# Altium schematic symbol library 6-Connectors 连接器.端子.SchLib: 402 symbols (part 1 of 5)
Pins are listed as number, name and electrical type; pins without a type are passive.

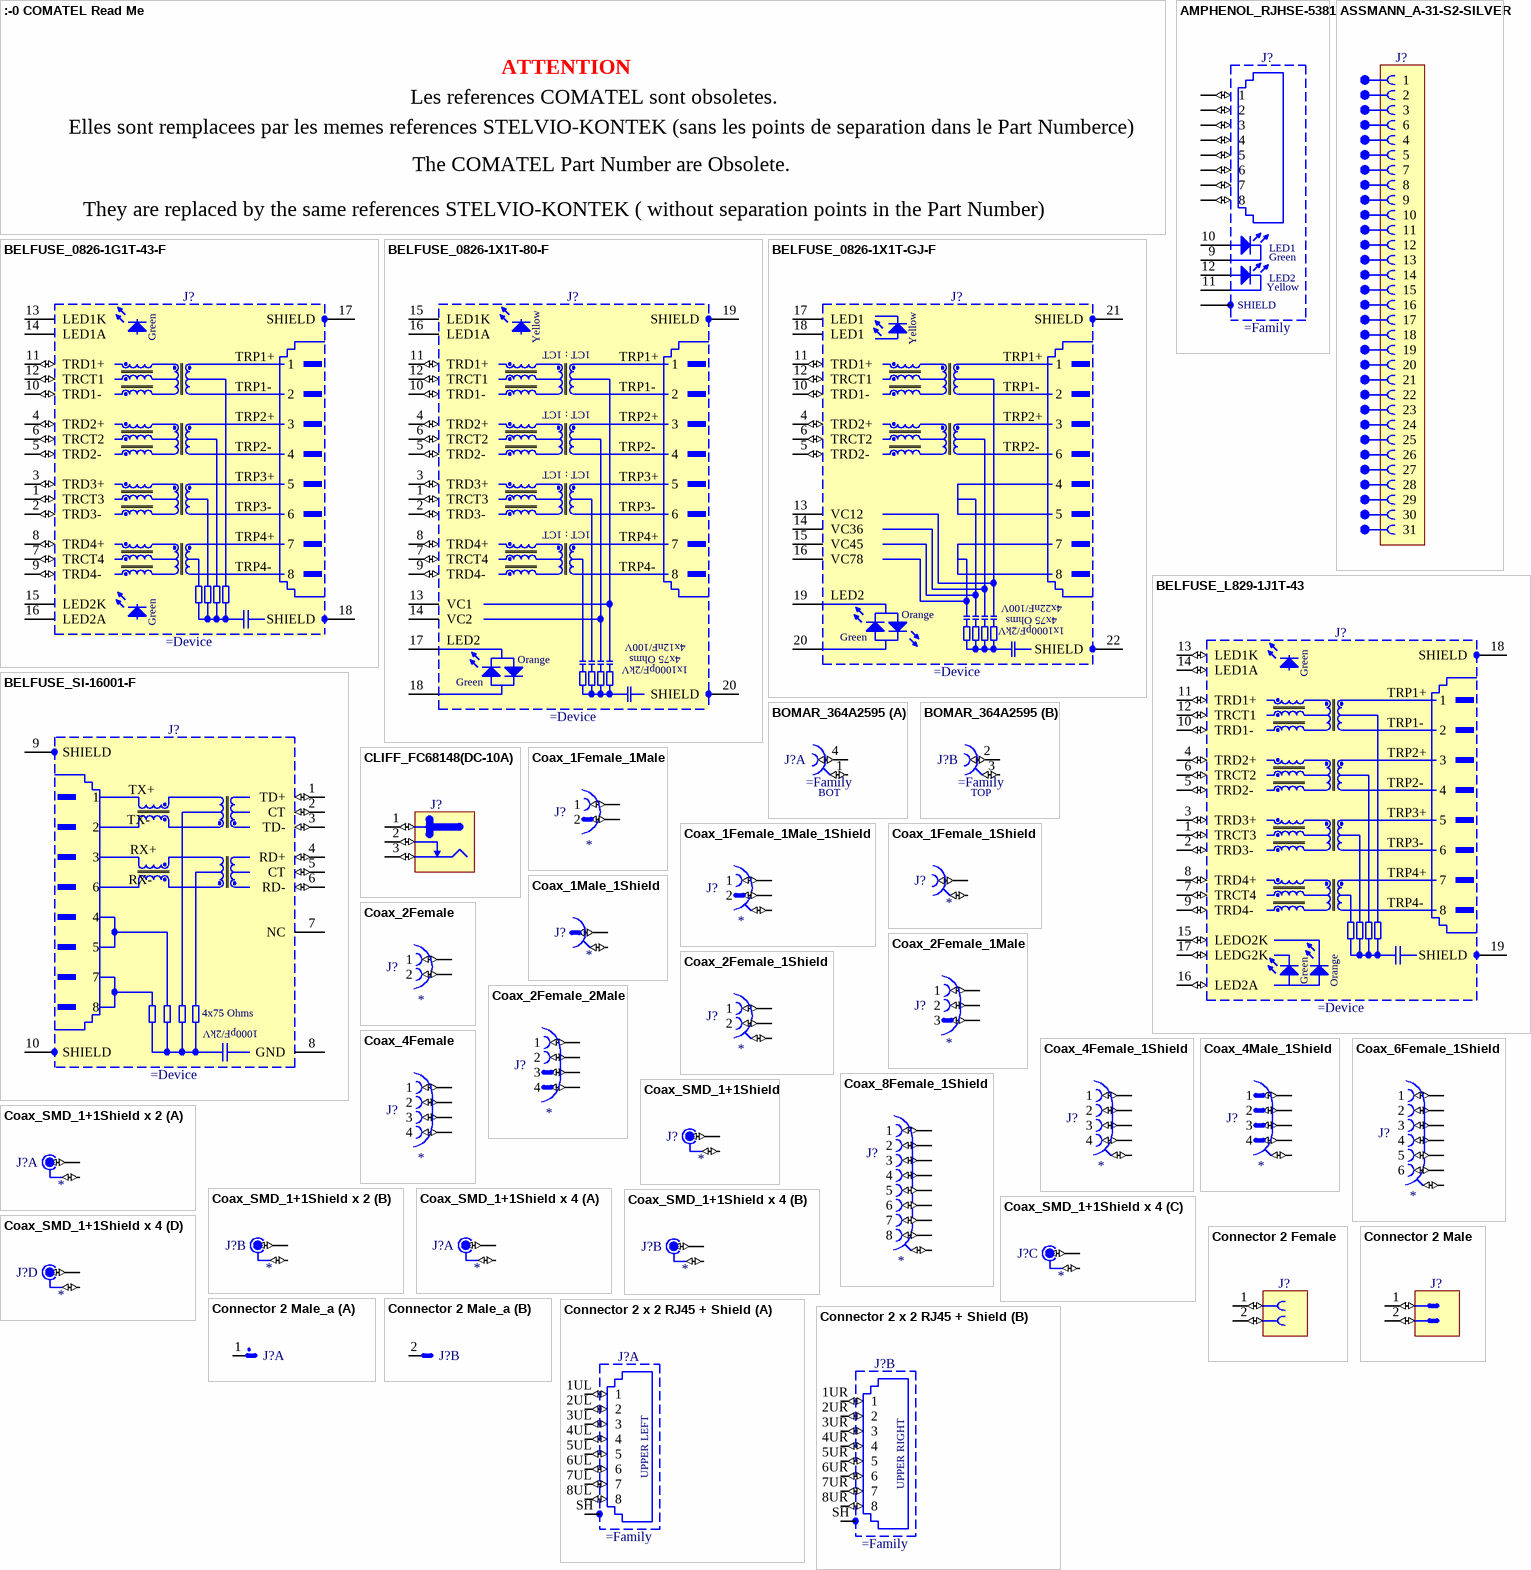
[diagram p0: symbols :-0 COMATEL Read Me to Connector 2 x 2 RJ45 + Shield]

## :-0 COMATEL Read Me
designator ATTENTION
Test Point
text: Les references COMATEL sont obsoletes.; Elles sont remplacees par les memes references STELVIO-KONTEK (sans les points de separation dans le Part Numberce); The COMATEL Part Number are Obsolete.; They are replaced by the same references STELVIO-KONTEK ( without separation points in the Part Number)

## AMPHENOL_RJHSE-5381
designator J?
1 Port, 8 Positions, CAT5 RJ45 Modular Connector With Yellow And Green LEDs
pins: 1 (io), 2 (io), 3 (io), 4 (io), 5 (io), 6 (io), 7 (io), 8 (io), 9 CLED1, 10 ALED1, 11 ALED2, 12 CLED2, SHIELD
text: LED1; Green; LED2; Yellow

## ASSMANN_A-31-S2-SILVER
designator J?
text: 1; 2; 3; 6; 4; 5; 7; 8; 9; 10; 11; 12; 13; 14; 15; 16; 17; 18; 19; 20; 21; 22; 23; 24; 25; 26; 27; 28; 29; 30; 31

## BELFUSE_0826-1G1T-43-F
designator J?
1 Port, Green/Green LEDs, RJ45 10/100/1000 Gigabit Ethernet, MagJack Connector Module
pins: 1 TRCT3 (io), 2 TRD3- (io), 3 TRD3+ (io), 4 TRD2+ (io), 5 TRD2- (io), 6 TRCT2 (io), 7 TRCT4 (io), 8 TRD4+ (io), 9 TRD4- (io), 10 TRD1- (io), 11 TRD1+ (io), 12 TRCT1 (io), 13 LED1K, 14 LED1A, 15 LED2K, 16 LED2A, 17 SHIELD (power), 18 SHIELD (power)
text: Green; TRP1+; TRP1-; TRP2+; TRP2-; TRP3+; TRP3-; TRP4+; TRP4-

## BELFUSE_0826-1X1T-80-F
designator J?
MagJack 1000BaseT, PoE+, 1X1, OG/Y, Tab Up, RoHS
pins: 1 TRCT3 (io), 2 TRD3- (io), 3 TRD3+ (io), 4 TRD2+ (io), 5 TRD2- (io), 6 TRCT2 (io), 7 TRCT4 (io), 8 TRD4+ (io), 9 TRD4- (io), 10 TRD1- (io), 11 TRD1+ (io), 12 TRCT1 (io), 13 VC1, 14 VC2, 15 LED1K, 16 LED1A, 17 LED2, 18 LED2, 19 SHIELD (power), 20 SHIELD (power)
text: Yellow; 1CT : 1CT; TRP1+; TRP1-; TRP2+; TRP2-; TRP3+; TRP3-; TRP4+; TRP4-; 4x12nF/100V; Orange; 4x75 Ohms; 1x1000pF/2kV; Green

## BELFUSE_0826-1X1T-GJ-F
designator J?
MagJack 10/100BaseT, PoE+, 1X1, OG/Y, -40 to 85*C, Tab Up, RoHS
pins: 4 TRD2+ (io), 5 TRD2- (io), 6 TRCT2 (io), 10 TRD1- (io), 11 TRD1+ (io), 12 TRCT1 (io), 13 VC12, 14 VC36, 15 VC45, 16 VC78, 17 LED1, 18 LED1, 19 LED2, 20 LED2, 21 SHIELD (power), 22 SHIELD (power)
text: Yellow; TRP1+; 1; TRP1-; 2; TRP2+; 3; TRP2-; 7; 8; Orange; 4x22nF/100V; 4x75 Ohms; Green; 1x1000pF/2kV

## BELFUSE_L829-1J1T-43
designator J?
1 Port, RJ45, Gigabit Ethernet, MagJack Connector Module With Yellow And Green/Orange LEDs,
pins: 1 TRCT3 (io), 2 TRD3- (io), 3 TRD3+ (io), 4 TRD2+ (io), 5 TRD2- (io), 6 TRCT2 (io), 7 TRCT4 (io), 8 TRD4+ (io), 9 TRD4- (io), 10 TRD1- (io), 11 TRD1+ (io), 12 TRCT1 (io), 13 LED1K (io), 14 LED1A (io), 15 LEDO2K (io), 16 LED2A (io), 17 LEDG2K (io), 18 SHIELD (power), 19 SHIELD (power)
text: Green; TRP1+; TRP1-; TRP2+; TRP2-; TRP3+; TRP3-; TRP4+; TRP4-; Orange

## BELFUSE_SI-16001-F
designator J?
1 Port, Without LED, RJ45 10/100Base-T Ethernet, MagJack® Vertical Connector Module
pins: 1 TD+ (io), 2 CT (io), 3 TD- (io), 4 RD+ (io), 5 CT (io), 6 RD- (io), 7 NC, 8 GND (power), 9 SHIELD (power), 10 SHIELD (power)
text: TX+; TX-; RX+; RX-; 4x75 Ohms; 1000pF/2kV

## BOMAR_364A2595
designator J?
Dual Right Angle 50 Ohm BNC Jack, White Valox Case
part A pins: 1 (io), 4 (io)
part B pins: 2 (io), 3 (io)
part A text: BOT
part B text: TOP

## CLIFF_FC68148(DC-10A)
designator J?
12V /  5A, 2.1mm Diameter Pin, DC Power Socket With  Switch. DC10A Type
pins: 1 (io), 2 (io), 3 (io)

## Coax_1Female_1Male
designator J?
Coax_1Female_1Male (No Shield)
pins: 1 (io), 2 (io)

## Coax_1Female_1Male_1Shield
designator J?
pins: 1 (io), 2 (io), 3 (io)

## Coax_1Female_1Shield
designator J?
pins: 1 (io), 2 (io)

## Coax_1Male_1Shield
designator J?
pins: 1 (io), 2 (io)

## Coax_2Female
designator J?
Coax_2Female (No Shield)
pins: 1 (io), 2 (io)

## Coax_2Female_1Male
designator J?
pins: 1 (io), 2 (io), 3 (io)

## Coax_2Female_1Shield
designator J?
pins: 1 (io), 2 (io), 3 (io)

## Coax_2Female_2Male
designator J?
pins: 1 (io), 2 (io), 3 (io), 4 (io)

## Coax_4Female
designator J?
pins: 1 (io), 2 (io), 3 (io), 4 (io)

## Coax_4Female_1Shield
designator J?
pins: 1 (io), 2 (io), 3 (io), 4 (io), 5 (io)

## Coax_4Male_1Shield
designator J?
pins: 1 (io), 2 (io), 3 (io), 4 (io), 5 (io)

## Coax_6Female_1Shield
designator J?
Coax 6 Contacts Female + 1 Shield
pins: 1 (io), 2 (io), 3 (io), 4 (io), 5 (io), 6 (io), 7 (io)

## Coax_8Female_1Shield
designator J?
pins: 1 (io), 2 (io), 3 (io), 4 (io), 5 (io), 6 (io), 7 (io), 8 (io), 9 (io)

## Coax_SMD_1+1Shield
designator J?
pins: 1 (io), 2 (io)

## Coax_SMD_1+1Shield x 2
designator J?
part A pins: 1 (io), 2 (io)
part B pins: 3 (io), 4 (io)

## Coax_SMD_1+1Shield x 4
designator J?
part A pins: 1 (io), 2 (io)
part B pins: 3 (io), 4 (io)
part C pins: 5 (io), 6 (io)
part D pins: 7 (io), 8 (io)

## Connector 2 Female
designator J?
Connector 2 Female
pins: 1 (io), 2 (io)
1 alternate drawing of the same symbol

## Connector 2 Male
designator J?
Connector 2 Male
pins: 1 (io), 2 (io)
1 alternate drawing of the same symbol

## Connector 2 Male_a
designator J?
Connector 2 Male
part A pins: 1 (io)
part B pins: 2 (io)

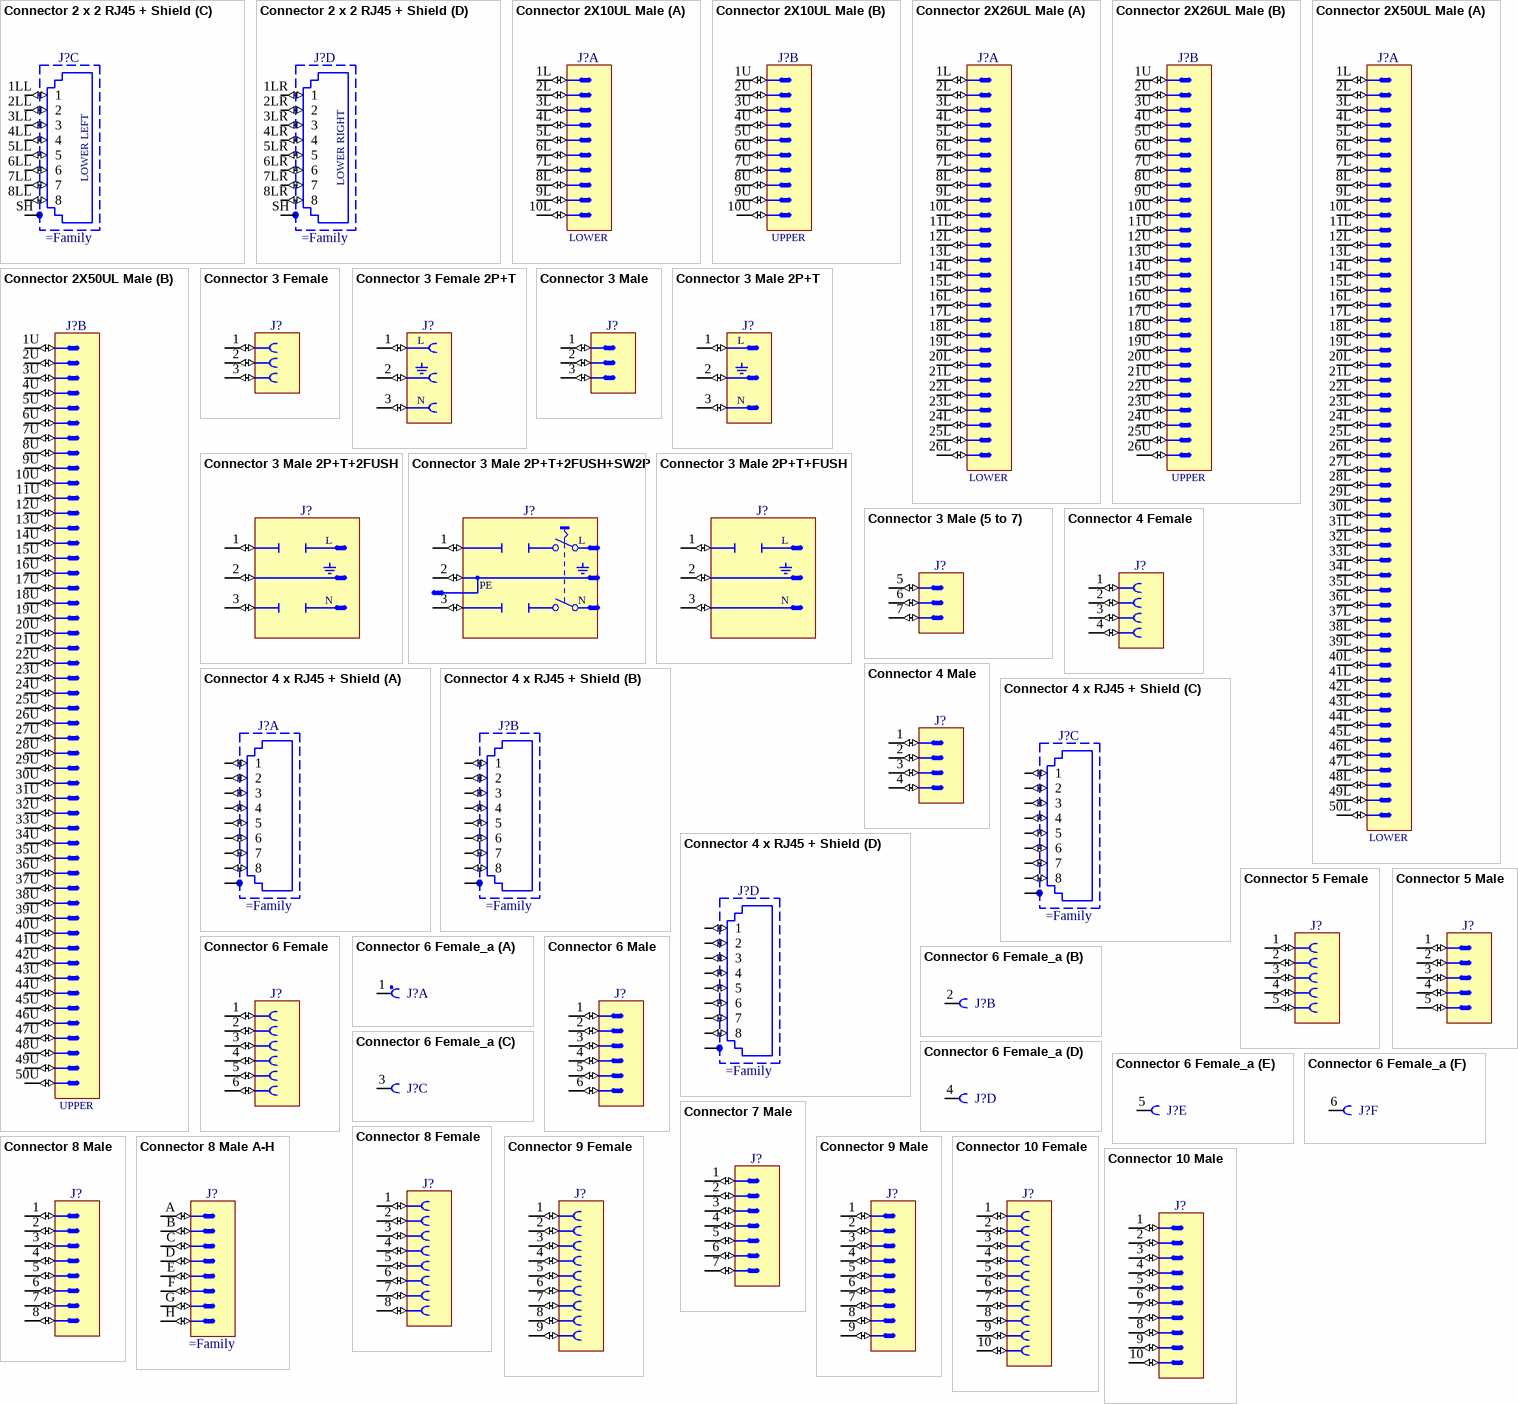
[diagram p1: symbols Connector 2 x 2 RJ45 + Shield to Connector 10 Male]

## Connector 2 x 2 RJ45 + Shield
designator J?
Connector 2 x 2 RJ45 + Shield
pins on every part: SH 1
part A pins: 1UL 1 (io), 2UL 2 (io), 3UL 3 (io), 4UL 4 (io), 5UL 5 (io), 6UL 6 (io), 7UL 7 (io), 8UL 8 (io)
part B pins: 1UR 1 (io), 2UR 2 (io), 3UR 3 (io), 4UR 4 (io), 5UR 5 (io), 6UR 6 (io), 7UR 7 (io), 8UR 8 (io)
part C pins: 1LL 1 (io), 2LL 2 (io), 3LL 3 (io), 4LL 4 (io), 5LL 5 (io), 6LL 6 (io), 7LL 7 (io), 8LL 8 (io)
part D pins: 1LR 1 (io), 2LR 2 (io), 3LR 3 (io), 4LR 4 (io), 5LR 5 (io), 6LR 6 (io), 7LR 7 (io), 8LR 8 (io)
part A text: UPPER LEFT
part B text: UPPER RIGHT
part C text: LOWER LEFT
part D text: LOWER RIGHT

## Connector 2X10UL Male
designator J?
Dual Stacked 10 Contact Male Connector
part A pins: 1L (io), 2L (io), 3L (io), 4L (io), 5L (io), 6L (io), 7L (io), 8L (io), 9L (io), 10L (io)
part B pins: 1U (io), 2U (io), 3U (io), 4U (io), 5U (io), 6U (io), 7U (io), 8U (io), 9U (io), 10U (io)
part A text: LOWER
part B text: UPPER

## Connector 2X26UL Male
designator J?
Dual Stacked 26 Contact Male Connector
part A pins: 1L (io), 2L (io), 3L (io), 4L (io), 5L (io), 6L (io), 7L (io), 8L (io), 9L (io), 10L (io), 11L (io), 12L (io), 13L (io), 14L (io), 15L (io), 16L (io), 17L (io), 18L (io), 19L (io), 20L (io), 21L (io), 22L (io), 23L (io), 24L (io), 25L (io), 26L (io)
part B pins: 1U (io), 2U (io), 3U (io), 4U (io), 5U (io), 6U (io), 7U (io), 8U (io), 9U (io), 10U (io), 11U (io), 12U (io), 13U (io), 14U (io), 15U (io), 16U (io), 17U (io), 18U (io), 19U (io), 20U (io), 21U (io), 22U (io), 23U (io), 24U (io), 25U (io), 26U (io)
part A text: LOWER
part B text: UPPER

## Connector 2X50UL Male
designator J?
Dual Stacked 50 Contact Male Connector
part A pins: 1L (io), 2L (io), 3L (io), 4L (io), 5L (io), 6L (io), 7L (io), 8L (io), 9L (io), 10L (io), 11L (io), 12L (io), 13L (io), 14L (io), 15L (io), 16L (io), 17L (io), 18L (io), 19L (io), 20L (io), 21L (io), 22L (io), 23L (io), 24L (io), 25L (io), 26L (io), 27L (io), 28L (io), 29L (io), 30L (io), 31L (io), 32L (io), 33L (io), 34L (io), 35L (io), 36L (io), 37L (io), 38L (io), 39L (io), 40L (io), 41L (io), 42L (io), 43L (io), 44L (io), 45L (io), 46L (io), 47L (io), 48L (io), 49L (io), 50L (io)
part B pins: 1U (io), 2U (io), 3U (io), 4U (io), 5U (io), 6U (io), 7U (io), 8U (io), 9U (io), 10U (io), 11U (io), 12U (io), 13U (io), 14U (io), 15U (io), 16U (io), 17U (io), 18U (io), 19U (io), 20U (io), 21U (io), 22U (io), 23U (io), 24U (io), 25U (io), 26U (io), 27U (io), 28U (io), 29U (io), 30U (io), 31U (io), 32U (io), 33U (io), 34U (io), 35U (io), 36U (io), 37U (io), 38U (io), 39U (io), 40U (io), 41U (io), 42U (io), 43U (io), 44U (io), 45U (io), 46U (io), 47U (io), 48U (io), 49U (io), 50U (io)
part A text: LOWER
part B text: UPPER

## Connector 3 Female
designator J?
Connector 3 Female
pins: 1 (io), 2 (io), 3 (io)
1 alternate drawing of the same symbol

## Connector 3 Female 2P+T
designator J?
Connector 3 Female 2P+T
pins: 1 (io), 2 (io), 3 (io)
text: L; N

## Connector 3 Male
designator J?
Connector 3 Male
pins: 1 (io), 2 (io), 3 (io)
1 alternate drawing of the same symbol

## Connector 3 Male 2P+T
designator J?
Connector 3 Male 2P+T
pins: 1 (io), 2 (io), 3 (io)
text: L; N

## Connector 3 Male 2P+T+2FUSH
designator J?
Connector 3 Male 2P+ 2 Fuse Holder
pins: 1 (io), 2 (io), 3 (io)
text: L; N

## Connector 3 Male 2P+T+2FUSH+SW2P
designator J?
Connector 3 Male 2P+ 2 Fuse Holder + Line Switch 2 Poles
pins: 1 (io), 2 (io), 3 (io)
text: L; PE; N

## Connector 3 Male 2P+T+FUSH
designator J?
Connector 3 Male 2P+ Fuse Holder
pins: 1 (io), 2 (io), 3 (io)
text: L; N

## Connector 3 Male (5 to 7)
designator J?
Connector 3 Male
pins: 5 (io), 6 (io), 7 (io)

## Connector 4 Female
designator J?
Connector 4 Female
pins: 1 (io), 2 (io), 3 (io), 4 (io)
1 alternate drawing of the same symbol

## Connector 4 Male
designator J?
Connector 4 Male
pins: 1 (io), 2 (io), 3 (io), 4 (io)
1 alternate drawing of the same symbol

## Connector 4 x RJ45 + Shield
designator J?
Connector 4 x RJ45 + Shield
pins on every part: SH 1
part A pins: 1A 1 (io), 2A 2 (io), 3A 3 (io), 4A 4 (io), 5A 5 (io), 6A 6 (io), 7A 7 (io), 8A 8 (io)
part B pins: 1B 1 (io), 2B 2 (io), 3B 3 (io), 4B 4 (io), 5B 5 (io), 6B 6 (io), 7B 7 (io), 8B 8 (io)
part C pins: 1C 1 (io), 2C 2 (io), 3C 3 (io), 4C 4 (io), 5C 5 (io), 6C 6 (io), 7C 7 (io), 8C 8 (io)
part D pins: 1D 1 (io), 2D 2 (io), 3D 3 (io), 4D 4 (io), 5D 5 (io), 6D 6 (io), 7D 7 (io), 8D 8 (io)

## Connector 5 Female
designator J?
Connector 5 Female
pins: 1 (io), 2 (io), 3 (io), 4 (io), 5 (io)
1 alternate drawing of the same symbol

## Connector 5 Male
designator J?
Connector 5 Male
pins: 1 (io), 2 (io), 3 (io), 4 (io), 5 (io)
1 alternate drawing of the same symbol

## Connector 6 Female
designator J?
Connector 6 Female
pins: 1 (io), 2 (io), 3 (io), 4 (io), 5 (io), 6 (io)
1 alternate drawing of the same symbol

## Connector 6 Female_a
designator J?
Connector 6 Female
part A pins: 1 (io)
part B pins: 2 (io)
part C pins: 3 (io)
part D pins: 4 (io)
part E pins: 5 (io)
part F pins: 6 (io)

## Connector 6 Male
designator J?
Connector 6 Male
pins: 1 (io), 2 (io), 3 (io), 4 (io), 5 (io), 6 (io)
1 alternate drawing of the same symbol

## Connector 7 Male
designator J?
Connector 7 Male
pins: 1 (io), 2 (io), 3 (io), 4 (io), 5 (io), 6 (io), 7 (io)
1 alternate drawing of the same symbol

## Connector 8 Female
designator J?
Connector 8 Female
pins: 1 (io), 2 (io), 3 (io), 4 (io), 5 (io), 6 (io), 7 (io), 8 (io)
1 alternate drawing of the same symbol

## Connector 8 Male
designator J?
Connector 8 Male
pins: 1 (io), 2 (io), 3 (io), 4 (io), 5 (io), 6 (io), 7 (io), 8 (io)
1 alternate drawing of the same symbol

## Connector 8 Male A-H
designator J?
Connector 8 Male A To H Contacts Numbering
pins: A (io), B (io), C (io), D (io), E (io), F (io), G (io), H (io)

## Connector 9 Female
designator J?
Connector 9 Female
pins: 1 (io), 2 (io), 3 (io), 4 (io), 5 (io), 6 (io), 7 (io), 8 (io), 9 (io)
1 alternate drawing of the same symbol

## Connector 9 Male
designator J?
Connector 9 Male
pins: 1 (io), 2 (io), 3 (io), 4 (io), 5 (io), 6 (io), 7 (io), 8 (io), 9 (io)
1 alternate drawing of the same symbol

## Connector 10 Female
designator J?
Connector 10 Female
pins: 1 (io), 2 (io), 3 (io), 4 (io), 5 (io), 6 (io), 7 (io), 8 (io), 9 (io), 10 (io)
1 alternate drawing of the same symbol

## Connector 10 Male
designator J?
Connector 10 Male
pins: 1 (io), 2 (io), 3 (io), 4 (io), 5 (io), 6 (io), 7 (io), 8 (io), 9 (io), 10 (io)
1 alternate drawing of the same symbol

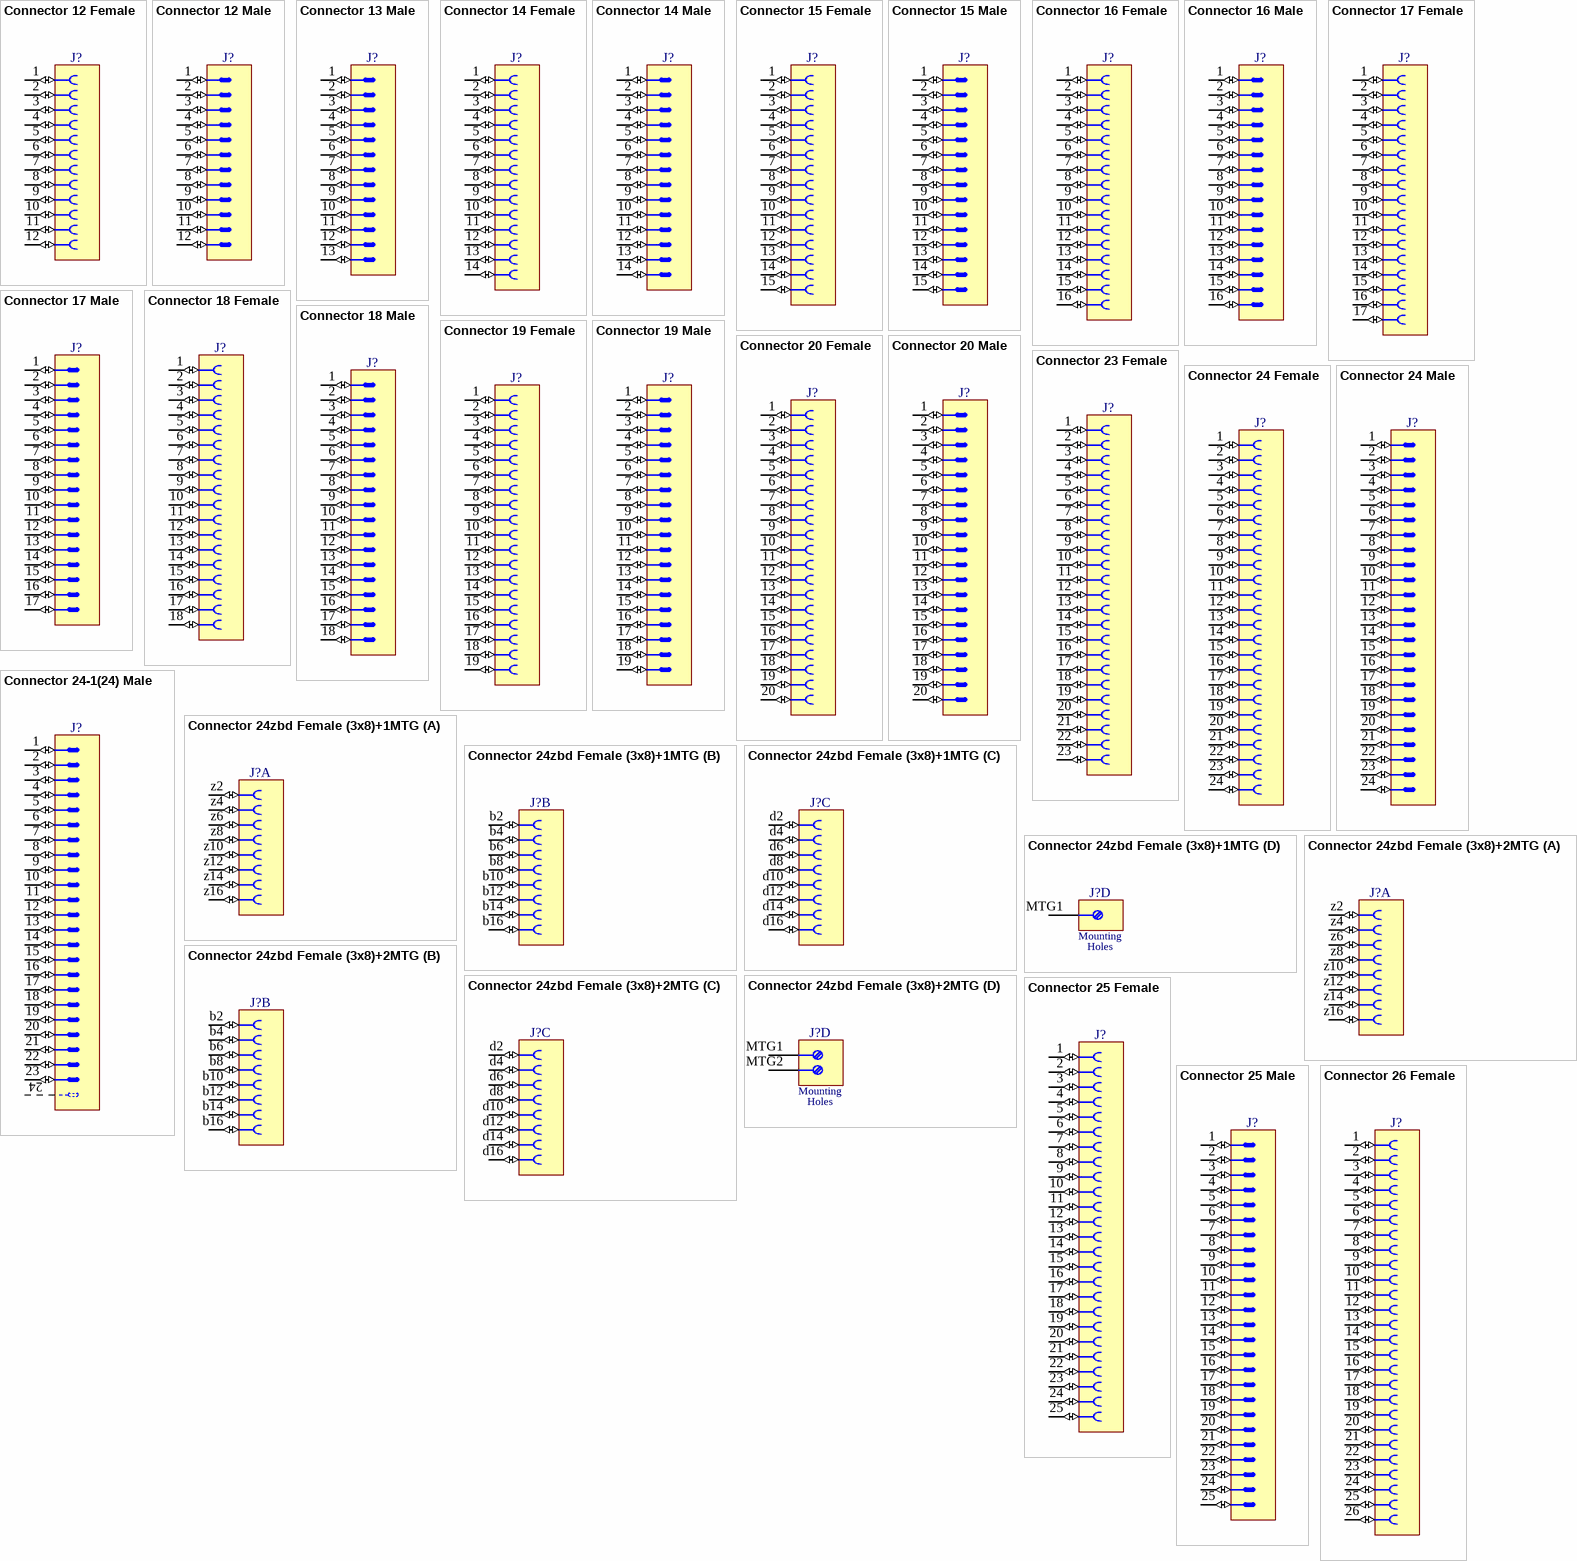
[diagram p2: symbols Connector 12 Female to Connector 26 Female]

## Connector 12 Female
designator J?
Connector 12 Female
pins: 1 (io), 2 (io), 3 (io), 4 (io), 5 (io), 6 (io), 7 (io), 8 (io), 9 (io), 10 (io), 11 (io), 12 (io)
1 alternate drawing of the same symbol

## Connector 12 Male
designator J?
Connector 12 Male
pins: 1 (io), 2 (io), 3 (io), 4 (io), 5 (io), 6 (io), 7 (io), 8 (io), 9 (io), 10 (io), 11 (io), 12 (io)
1 alternate drawing of the same symbol

## Connector 13 Male
designator J?
Connector 13 Male
pins: 1 (io), 2 (io), 3 (io), 4 (io), 5 (io), 6 (io), 7 (io), 8 (io), 9 (io), 10 (io), 11 (io), 12 (io), 13 (io)
1 alternate drawing of the same symbol

## Connector 14 Female
designator J?
Connector 14 Female
pins: 1 (io), 2 (io), 3 (io), 4 (io), 5 (io), 6 (io), 7 (io), 8 (io), 9 (io), 10 (io), 11 (io), 12 (io), 13 (io), 14 (io)
1 alternate drawing of the same symbol

## Connector 14 Male
designator J?
Connector 14 Male
pins: 1 (io), 2 (io), 3 (io), 4 (io), 5 (io), 6 (io), 7 (io), 8 (io), 9 (io), 10 (io), 11 (io), 12 (io), 13 (io), 14 (io)
1 alternate drawing of the same symbol

## Connector 15 Female
designator J?
Connector 15 Female
pins: 1 (io), 2 (io), 3 (io), 4 (io), 5 (io), 6 (io), 7 (io), 8 (io), 9 (io), 10 (io), 11 (io), 12 (io), 13 (io), 14 (io), 15 (io)
1 alternate drawing of the same symbol

## Connector 15 Male
designator J?
Connector 15 Male
pins: 1 (io), 2 (io), 3 (io), 4 (io), 5 (io), 6 (io), 7 (io), 8 (io), 9 (io), 10 (io), 11 (io), 12 (io), 13 (io), 14 (io), 15 (io)
1 alternate drawing of the same symbol

## Connector 16 Female
designator J?
Connector 16 Female
pins: 1 (io), 2 (io), 3 (io), 4 (io), 5 (io), 6 (io), 7 (io), 8 (io), 9 (io), 10 (io), 11 (io), 12 (io), 13 (io), 14 (io), 15 (io), 16 (io)
1 alternate drawing of the same symbol

## Connector 16 Male
designator J?
Connector 16 Male
pins: 1 (io), 2 (io), 3 (io), 4 (io), 5 (io), 6 (io), 7 (io), 8 (io), 9 (io), 10 (io), 11 (io), 12 (io), 13 (io), 14 (io), 15 (io), 16 (io)
1 alternate drawing of the same symbol

## Connector 17 Female
designator J?
Connector 17 Female
pins: 1 (io), 2 (io), 3 (io), 4 (io), 5 (io), 6 (io), 7 (io), 8 (io), 9 (io), 10 (io), 11 (io), 12 (io), 13 (io), 14 (io), 15 (io), 16 (io), 17 (io)
1 alternate drawing of the same symbol

## Connector 17 Male
designator J?
Connector 17 Male
pins: 1 (io), 2 (io), 3 (io), 4 (io), 5 (io), 6 (io), 7 (io), 8 (io), 9 (io), 10 (io), 11 (io), 12 (io), 13 (io), 14 (io), 15 (io), 16 (io), 17 (io)
1 alternate drawing of the same symbol

## Connector 18 Female
designator J?
Connector 18 Female
pins: 1 (io), 2 (io), 3 (io), 4 (io), 5 (io), 6 (io), 7 (io), 8 (io), 9 (io), 10 (io), 11 (io), 12 (io), 13 (io), 14 (io), 15 (io), 16 (io), 17 (io), 18 (io)
1 alternate drawing of the same symbol

## Connector 18 Male
designator J?
Connector 18 Male
pins: 1 (io), 2 (io), 3 (io), 4 (io), 5 (io), 6 (io), 7 (io), 8 (io), 9 (io), 10 (io), 11 (io), 12 (io), 13 (io), 14 (io), 15 (io), 16 (io), 17 (io), 18 (io)
1 alternate drawing of the same symbol

## Connector 19 Female
designator J?
Connector 19 Female
pins: 1 (io), 2 (io), 3 (io), 4 (io), 5 (io), 6 (io), 7 (io), 8 (io), 9 (io), 10 (io), 11 (io), 12 (io), 13 (io), 14 (io), 15 (io), 16 (io), 17 (io), 18 (io), 19 (io)
1 alternate drawing of the same symbol

## Connector 19 Male
designator J?
Connector 19 Male
pins: 1 (io), 2 (io), 3 (io), 4 (io), 5 (io), 6 (io), 7 (io), 8 (io), 9 (io), 10 (io), 11 (io), 12 (io), 13 (io), 14 (io), 15 (io), 16 (io), 17 (io), 18 (io), 19 (io)
1 alternate drawing of the same symbol

## Connector 20 Female
designator J?
Connector 20 Female
pins: 1 (io), 2 (io), 3 (io), 4 (io), 5 (io), 6 (io), 7 (io), 8 (io), 9 (io), 10 (io), 11 (io), 12 (io), 13 (io), 14 (io), 15 (io), 16 (io), 17 (io), 18 (io), 19 (io), 20 (io)
1 alternate drawing of the same symbol

## Connector 20 Male
designator J?
Connector 20 Male
pins: 1 (io), 2 (io), 3 (io), 4 (io), 5 (io), 6 (io), 7 (io), 8 (io), 9 (io), 10 (io), 11 (io), 12 (io), 13 (io), 14 (io), 15 (io), 16 (io), 17 (io), 18 (io), 19 (io), 20 (io)
1 alternate drawing of the same symbol

## Connector 23 Female
designator J?
Connector 23 Female
pins: 1 (io), 2 (io), 3 (io), 4 (io), 5 (io), 6 (io), 7 (io), 8 (io), 9 (io), 10 (io), 11 (io), 12 (io), 13 (io), 14 (io), 15 (io), 16 (io), 17 (io), 18 (io), 19 (io), 20 (io), 21 (io), 22 (io), 23 (io)
1 alternate drawing of the same symbol

## Connector 24 Female
designator J?
Connector 24 Female
pins: 1 (io), 2 (io), 3 (io), 4 (io), 5 (io), 6 (io), 7 (io), 8 (io), 9 (io), 10 (io), 11 (io), 12 (io), 13 (io), 14 (io), 15 (io), 16 (io), 17 (io), 18 (io), 19 (io), 20 (io), 21 (io), 22 (io), 23 (io), 24 (io)
1 alternate drawing of the same symbol

## Connector 24 Male
designator J?
Connector 24 Male
pins: 1 (io), 2 (io), 3 (io), 4 (io), 5 (io), 6 (io), 7 (io), 8 (io), 9 (io), 10 (io), 11 (io), 12 (io), 13 (io), 14 (io), 15 (io), 16 (io), 17 (io), 18 (io), 19 (io), 20 (io), 21 (io), 22 (io), 23 (io), 24 (io)
1 alternate drawing of the same symbol

## Connector 24-1(24) Male
designator J?
Connector 24 Male With Polarized Position Number 24
pins: 1 (io), 2 (io), 3 (io), 4 (io), 5 (io), 6 (io), 7 (io), 8 (io), 9 (io), 10 (io), 11 (io), 12 (io), 13 (io), 14 (io), 15 (io), 16 (io), 17 (io), 18 (io), 19 (io), 20 (io), 21 (io), 22 (io), 23 (io)
1 alternate drawing of the same symbol
text: 24

## Connector 24zbd Female (3x8)+1MTG
designator J?
Connector 24zbd Female, DIN 41612 Type MH
part A pins: z2 (io), z4 (io), z6 (io), z8 (io), z10 (io), z12 (io), z14 (io), z16 (io)
part B pins: b2 (io), b4 (io), b6 (io), b8 (io), b10 (io), b12 (io), b14 (io), b16 (io)
part C pins: d2 (io), d4 (io), d6 (io), d8 (io), d10 (io), d12 (io), d14 (io), d16 (io)
part D pins: MTG1 "Mounting Fixture"
part D text: Mounting; Holes

## Connector 24zbd Female (3x8)+2MTG
designator J?
Connector 24zbd Female, DIN 41612 Type MH
part A pins: z2 (io), z4 (io), z6 (io), z8 (io), z10 (io), z12 (io), z14 (io), z16 (io)
part B pins: b2 (io), b4 (io), b6 (io), b8 (io), b10 (io), b12 (io), b14 (io), b16 (io)
part C pins: d2 (io), d4 (io), d6 (io), d8 (io), d10 (io), d12 (io), d14 (io), d16 (io)
part D pins: MTG1 "Mounting Fixture", MTG2 "Mounting Fixture"
part D text: Mounting; Holes

## Connector 25 Female
designator J?
Connector 25 Female
pins: 1 (io), 2 (io), 3 (io), 4 (io), 5 (io), 6 (io), 7 (io), 8 (io), 9 (io), 10 (io), 11 (io), 12 (io), 13 (io), 14 (io), 15 (io), 16 (io), 17 (io), 18 (io), 19 (io), 20 (io), 21 (io), 22 (io), 23 (io), 24 (io), 25 (io)
1 alternate drawing of the same symbol

## Connector 25 Male
designator J?
Connector 25 Male
pins: 1 (io), 2 (io), 3 (io), 4 (io), 5 (io), 6 (io), 7 (io), 8 (io), 9 (io), 10 (io), 11 (io), 12 (io), 13 (io), 14 (io), 15 (io), 16 (io), 17 (io), 18 (io), 19 (io), 20 (io), 21 (io), 22 (io), 23 (io), 24 (io), 25 (io)
1 alternate drawing of the same symbol

## Connector 26 Female
designator J?
Connector 26 Female
pins: 1 (io), 2 (io), 3 (io), 4 (io), 5 (io), 6 (io), 7 (io), 8 (io), 9 (io), 10 (io), 11 (io), 12 (io), 13 (io), 14 (io), 15 (io), 16 (io), 17 (io), 18 (io), 19 (io), 20 (io), 21 (io), 22 (io), 23 (io), 24 (io), 25 (io), 26 (io)
1 alternate drawing of the same symbol
